# Altium footprint library lib_datalogger.PcbLib: 866 footprints (part 55 of 55)
Each footprint in its own frame and in the unit in brackets; x right, y up, seen from the top. Pads: shape width x height; smd on the part's side, far side on the other; paste and mask are expansions set on the pad; w line width, h text height; cw(c..) or ccw(c..) is an arc to the next point about the centre after c.
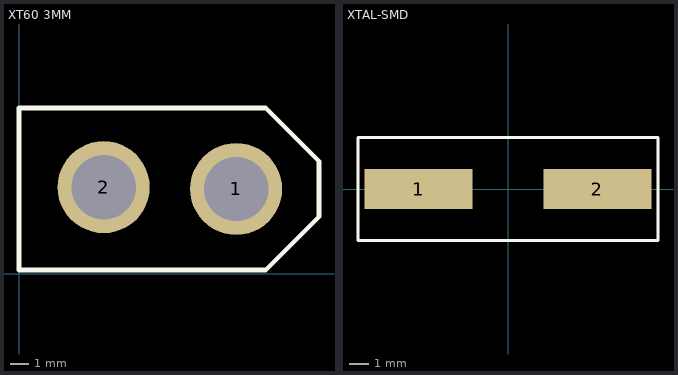
[diagram p54: the footprints below, top view; thin cyan lines are the x and y axes]

## XT60 3MM [mm]
pads (2):
  round 5 hole 3.5: 1(11.8,4.6) 2(4.6,4.7)
Top Overlay:
  lines w0.254: 0,0.2 0,9 13.4,9 16.3,6.1 16.3,3.1 13.4,0.2 0,0.2
3D body "User Library-XT60-2.STEP": height 15.7, standoff -4.5, extent 0.35,0.6 15.85,8.7

## XTAL-SMD [mil]
pads (2):
  rect 214x80 smd: 1(-177,0) 2(177,0)
Top Overlay:
  lines w6: -297,-102 297,-102 297,0 297,102 -297,102 -297,0 -297,-102
3D body "hc49_cystal.step": height 200, standoff 0, extent -263.78,-96.46 263.78,96.46